# Altium integrated library BYTECH_HW_LIB_2019.IntLib: 907 symbols (part 5 of 6) (continued)
## W3073 (continued)
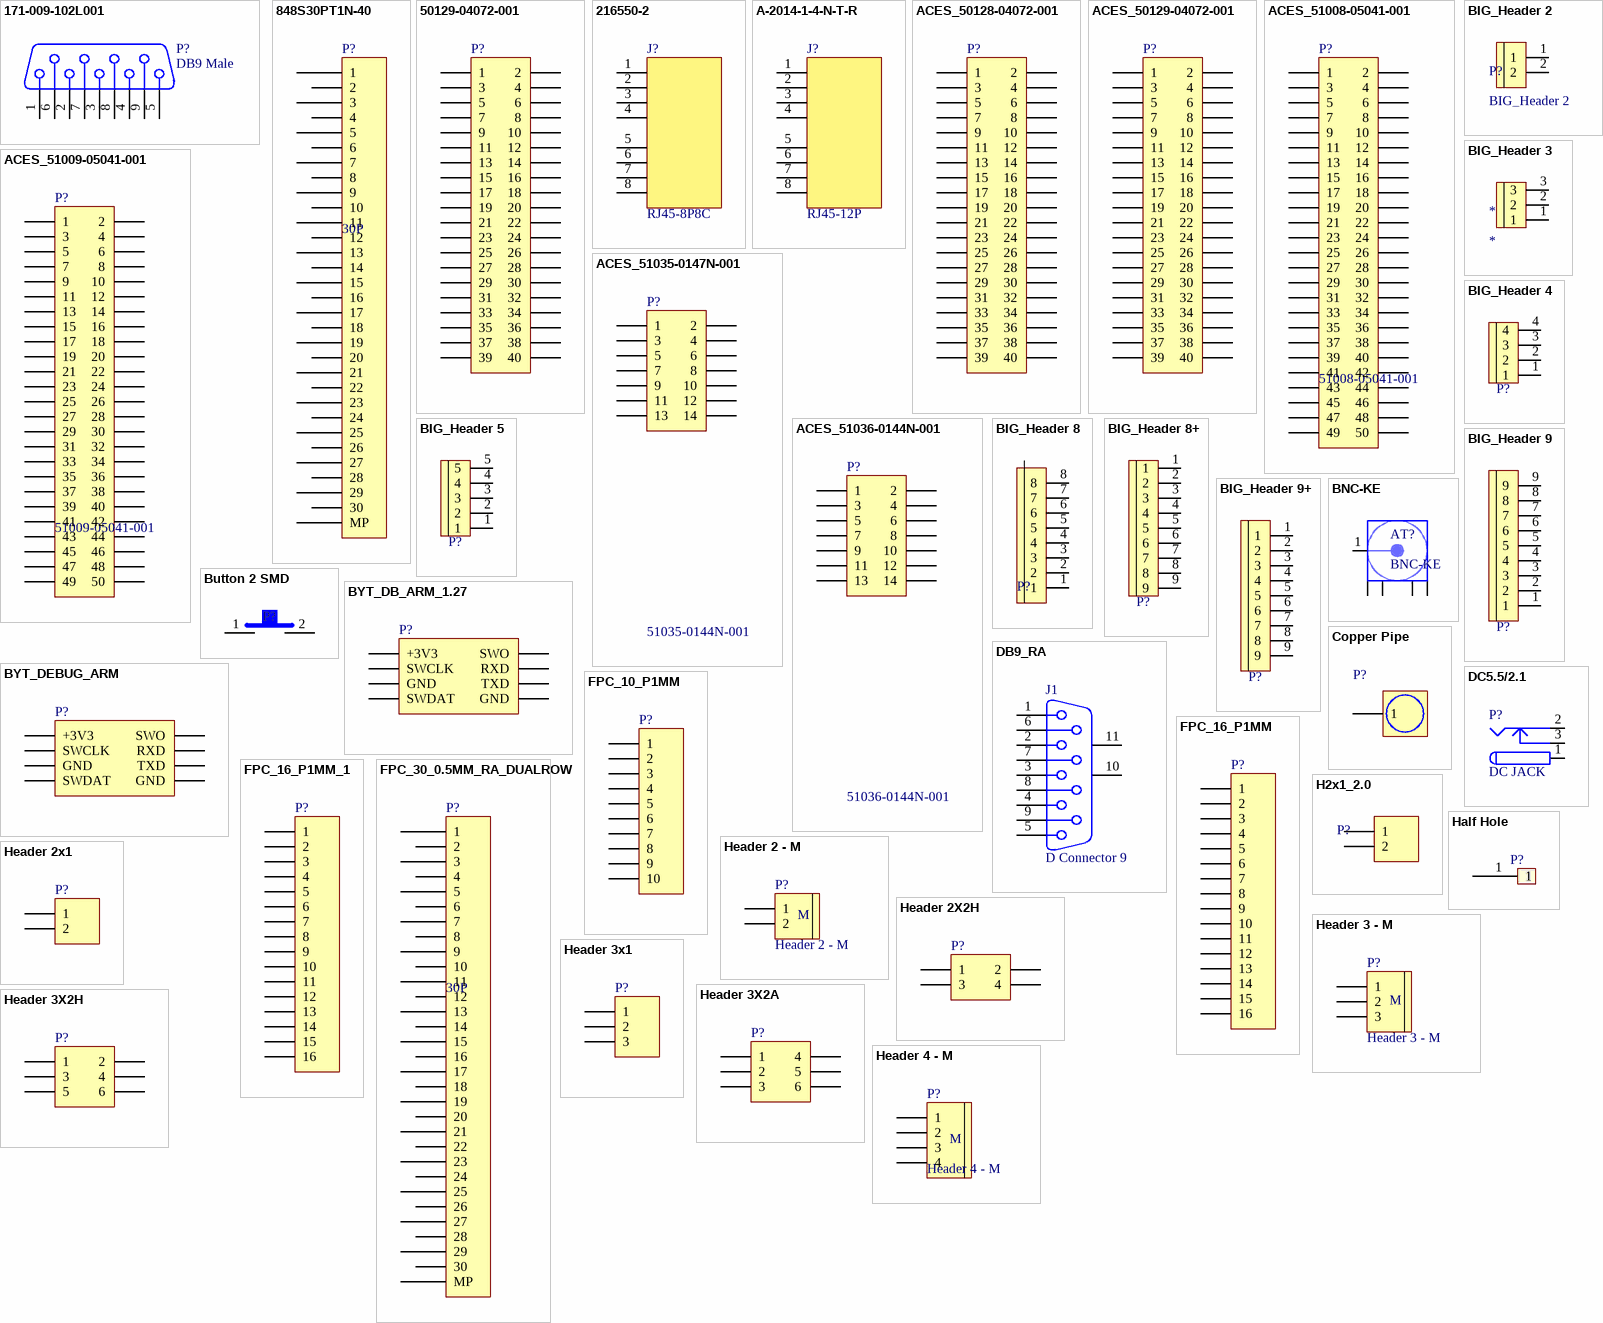
[diagram p31: symbols 171-009-102L001 to Header 4 - M]

## 171-009-102L001
designator P?, comment DB9 Male
Receptacle Assembly, 9 Position, Right Angle; MPN: 171-009-102L001; CompanyID: VT-00352; Solder: HAND; Value: DB9 Male
footprint DB9.SMD
signal-integrity model Connector
pins: 1, 2, 3, 4, 5, 6, 7, 8, 9

## 848S30PT1N-40
designator P?, comment 30P
FPC_30_0.5MM_RA_DUALROW; MFR: Ariba; MPN: 848S30PT1N-40; Solder: SMT; MFR_URL: https://item.taobao.com/item.htm?id=584733985113; Value: 30P
footprint 848S30PT1N-40 (Footprint not found)
pins: 0 MP, 1, 2, 3, 4, 5, 6, 7, 8, 9, 10, 11, 12, 13, 14, 15, 16, 17, 18, 19, 20, 21, 22, 23, 24, 25, 26, 27, 28, 29, 30

## 50129-04072-001
designator P?
Header, 20-Pin, Dual row, Right Angle; MFR: ACES; MPN: 50129-04072-001; Solder: WAVE; Value: 50129-04072-001
footprint ACES_50128-04072-001 (Footprint not found)
signal-integrity model Connector
pins: 1, 2, 3, 4, 5, 6, 7, 8, 9, 10, 11, 12, 13, 14, 15, 16, 17, 18, 19, 20, 21, 22, 23, 24, 25, 26, 27, 28, 29, 30, 31, 32, 33, 34, 35, 36, 37, 38, 39, 40

## 216550-2
designator J?, comment RJ45-8P8C
CONN MOD JACK 8P8C VERT UNSHLD; MFR: TE Connectivity AMP Connectors; MPN: 216550-2; Solder: WAVE
footprint 216550-2 (Footprint not found)
pins: 1, 2, 3, 4, 5, 6, 7, 8

## A-2014-1-4-N-T-R
designator J?, comment RJ45-12P
Solder: WAVE
footprint A-2014-1-4-N-T-R (Footprint not found)
pins: 1, 2, 3, 4, 5, 6, 7, 8

## ACES_50128-04072-001
designator P?
50128-04072-001 Dual Row, 40 pin, MALE; MFR: ACES; Solder: SMT; MPN: 50128-04072-001; Value: 50128-04072-001
footprint ACES_50128-04072-001 (Footprint not found)
signal-integrity model Connector
pins: 1, 2, 3, 4, 5, 6, 7, 8, 9, 10, 11, 12, 13, 14, 15, 16, 17, 18, 19, 20, 21, 22, 23, 24, 25, 26, 27, 28, 29, 30, 31, 32, 33, 34, 35, 36, 37, 38, 39, 40

## ACES_50129-04072-001
designator P?
50129-04072-001 Dual Row, 40 pin, FEMALE; MFR: ACES; Solder: SMT; MPN: 50129-04072-001; Value: 50129-04072-001
footprint ACES_50129-04072-001 (Footprint not found)
signal-integrity model Connector
pins: 1, 2, 3, 4, 5, 6, 7, 8, 9, 10, 11, 12, 13, 14, 15, 16, 17, 18, 19, 20, 21, 22, 23, 24, 25, 26, 27, 28, 29, 30, 31, 32, 33, 34, 35, 36, 37, 38, 39, 40

## ACES_51008-05041-001
designator P?, comment 51008-05041-001
51008-05041-001 Dual Row, 50 pin, MALE; MFR: ACES; MPN: ACES_51008-05041-001; Solder: SMT; Value: ACES_51008-05041-001; MPN2: 10132798-052100LF; MFR2: Amphenol ICC (FCI)
footprint ACES_51008-05041-001 (Footprint not found)
signal-integrity model Connector
pins: 1, 2, 3, 4, 5, 6, 7, 8, 9, 10, 11, 12, 13, 14, 15, 16, 17, 18, 19, 20, 21, 22, 23, 24, 25, 26, 27, 28, 29, 30, 31, 32, 33, 34, 35, 36, 37, 38, 39, 40, 41, 42, 43, 44, 45, 46, 47, 48, 49, 50

## ACES_51009-05041-001
designator P?, comment 51009-05041-001
51009-05041-001 Dual Row, 50 pin, FEMALE; MFR: ACES; MPN: ACES_51009-05041-001; Solder: SMT; MPN2: 10132797-055100LF; MFR2: Amphenol ICC (FCI)
footprint ACES_51009-05041-001
signal-integrity model Connector
pins: 1, 2, 3, 4, 5, 6, 7, 8, 9, 10, 11, 12, 13, 14, 15, 16, 17, 18, 19, 20, 21, 22, 23, 24, 25, 26, 27, 28, 29, 30, 31, 32, 33, 34, 35, 36, 37, 38, 39, 40, 41, 42, 43, 44, 45, 46, 47, 48, 49, 50

## ACES_51035-0147N-001
designator P?, comment 51035-0144N-001
51035-0147N-001 Dual Row, 14 pin, MALE; MFR: ACES; Solder: SMT; MPN: 51035-0147N-001; Value: 51035-0147N-001
footprint ACES_51035-0147N-001 (Footprint not found)
signal-integrity model Connector
pins: 1, 2, 3, 4, 5, 6, 7, 8, 9, 10, 11, 12, 13, 14

## ACES_51036-0144N-001
designator P?, comment 51036-0144N-001
51036-0144N-001 Dual Row, 14 pin, FEMALE; MFR: ACES; Solder: SMT; MPN: 51036-0144N-001; Value: 51036-0144N-001
footprint ACES_51036-0144N-001 (Footprint not found)
signal-integrity model Connector
pins: 1, 2, 3, 4, 5, 6, 7, 8, 9, 10, 11, 12, 13, 14

## BIG_Header 2
designator P?
footprint BIG_Header 2
pins: 1, 2

## BIG_Header 3
designator *
footprint BIG_Header 3
pins: 1, 2, 3

## BIG_Header 4
designator P?, comment BIG Header 4  (value not drawn)
footprint BIG_Header 4
pins: 1, 2, 3, 4

## BIG_Header 5
designator P?, comment BIG Header 4  (value not drawn)
footprint BIG_Header 5
pins: 1, 2, 3, 4, 5

## BIG_Header 8
designator P?, comment BIG Heager 8  (value not drawn)
footprint BIG_Header 8
pins: 1, 2, 3, 4, 5, 6, 7, 8

## BIG_Header 8+
designator P?, comment BIG Heager 8+  (value not drawn)
footprint BIG_Header 9
pins: 1, 2, 3, 4, 5, 6, 7, 8, 9

## BIG_Header 9
designator P?, comment BIG Heager 9  (value not drawn)
footprint BIG_Header 9
pins: 1, 2, 3, 4, 5, 6, 7, 8, 9

## BIG_Header 9+
designator P?, comment BIG Heager 9+  (value not drawn)
footprint BIG_Header 9
pins: 1, 2, 3, 4, 5, 6, 7, 8, 9

## BNC-KE
designator AT?
Solder: WAVE; MFR_URL: https://detail.tmall.com/item.htm?id=600889032311&ali_refid=a3_430620_1006:1106519694:N:bqURkf1/6XELXFWgHn0phw==:e744e300de7662eb842b86005d159f1e&ali_trackid=1_e744e300de7662eb842b86005d159f1e&spm=a230r.1.14.1&skuId=4376461827836; MPN: BNC-KE
footprint BNC-KE
pins: 1 Signal "Signal Pin", 2 (power), 2 (power), 2 (power), 2 (power)

## Button 2 SMD
designator P?
SMD Mini Push Button Switch 2 Pin 3x6x2.7mm; MPN: SMD Mini Push Button 2 SMD; Link: https://ram-e-shop.com/product/press2pin-smd/
footprint SW 2P SMD
pins: 1, 2

## BYT_DB_ARM_1.27
designator P?
BYTECH DEBUG PORT FOR ARM; Solder: WAVE
footprint IDE8 1.27mm
signal-integrity model Connector
footprint HDR2X4_CEN - 2MM (Connector; Header; 4x2 Position)
pins: 1 +3V3, 2 SWO, 3 SWCLK, 4 RXD, 5 GND, 6 TXD, 7 SWDAT, 8 GND

## BYT_DEBUG_ARM
designator P?
BYTECH DEBUG PORT FOR ARM; Solder: WAVE
footprint HDR2X4_CEN (Connector; Header; 4x2 Position)
signal-integrity model Connector
footprint HDR2X4_CEN - 2MM (Connector; Header; 4x2 Position)
pins: 1 +3V3, 2 SWCLK, 3 GND, 4 SWDAT, 5 SWO, 6 RXD, 7 TXD, 8 GND

## Copper Pipe
designator P?
Copper Pipe M3; Solder: WAVE
footprint Copper Pipe M3
pins: 1

## DB9_RA
designator J1, comment D Connector 9
Receptacle Assembly, 9 Position, Right Angle; PackageDocument: O; Positions: 9; Published: 15-Jun-2001; LatestRevisionDate: 17-Jul-2002; LatestRevisionNote: Re-released for DXP Platform.; DatasheetDocument: 1-Sep-1999; PackageReference: 788750; Publisher: Altium Limited; Orientation: Right Angle; Gender: Receptacle
footprint DSUB1.385-2H9 (Connector; D Subminiature; 9 Position; Right Angle; Pitch 1.385 mm)
signal-integrity model Connector
pins: 1, 2, 3, 4, 5, 6, 7, 8, 9, 10 MH1, 11 MH2

## DC5.5/2.1
designator P?, comment DC JACK
Low Voltage Power Supply Connector; Solder: WAVE
footprint DC5.5/2.1 (DC JACK 5.5/2.1mm)
signal-integrity model Connector
pins: 1 (power), 2 (power), 3 (power)

## FPC_10_P1MM
designator P?
Header, 10-Pin; Solder: SMT
footprint FPC_10_P1MM (Footprint not found)
pins: 1, 2, 3, 4, 5, 6, 7, 8, 9, 10

## FPC_16_P1MM
designator P?
Header, 16-Pin; Solder: SMT
footprint FPC_16_P1MM (Footprint not found)
pins: 1, 2, 3, 4, 5, 6, 7, 8, 9, 10, 11, 12, 13, 14, 15, 16

## FPC_16_P1MM_1
designator P?
Header, 16-Pin; Solder: SMT
footprint FPC_16_P1MM (Footprint not found)
pins: 1, 2, 3, 4, 5, 6, 7, 8, 9, 10, 11, 12, 13, 14, 15, 16

## FPC_30_0.5MM_RA_DUALROW
designator P?, comment 30P
FPC_30_0.5MM_RA_DUALROW; MFR: AISU; Solder: SMT; MFR_URL: https://detail.tmall.com/item.htm?id=580113708551&rn=8ff0bf25cc32f12d0ad2de94d2fc9809&abbucket=6&skuId=3867202437827; Value: 30P
footprint FPC_30_0.5MM_RA_DUALROW_HAND
footprint FPC_30_0.5MM_RA_DUALROW_SMT
pins: 0 MP, 1, 2, 3, 4, 5, 6, 7, 8, 9, 10, 11, 12, 13, 14, 15, 16, 17, 18, 19, 20, 21, 22, 23, 24, 25, 26, 27, 28, 29, 30

## H2x1_2.0
designator P?
Header 2x1, pitch 2mm; Solder: WAVE
footprint HDR200_1x2
pins: 1, 2

## Half Hole
designator P?, comment 1  (value not drawn)
footprint Hafl Hole 0.7mm
pins: 1

## Header 2 - M
designator P?
Header, 2-Pin, Medium; LatestRevisionDate: 17-Jul-2002; LatestRevisionNote: Re-released for DXP Platform.; Publisher: Altium Limited
footprint Medium - Header 2
signal-integrity model Connector
pins: 1, 2
text: M

## Header 2x1
designator P?
Header, 2-Pin, pitch 2.54mm; Solder: WAVE
footprint HDR1X2 (Connector; Header; 2 Position)
signal-integrity model Connector
pins: 1, 2

## Header 2X2H
designator P?
Header, 2-Pin, Dual row, Right Angle; Solder: WAVE
footprint HDR2X2H (Connector; Header; 2x2 Position; Right Angle)
signal-integrity model Connector
pins: 1, 2, 3, 4

## Header 3 - M
designator P?
Header, 3-Pin, Medium; LatestRevisionDate: 17-Jul-2002; LatestRevisionNote: Re-released for DXP Platform.; Publisher: Altium Limited
footprint Medium - Header 3
signal-integrity model Connector
pins: 1, 2, 3
text: M

## Header 3x1
designator P?
Header, 3-Pin, pitch 2.54mm; Solder: WAVE
footprint HDR1X3 (Connector; Header; 3 Position)
signal-integrity model Connector
pins: 1, 2, 3

## Header 3X2A
designator P?
Header, 3-Pin, Dual row; Solder: WAVE
footprint HDR2X3_CEN (Connector; Header; 3x2 Position)
signal-integrity model Connector
pins: 1, 2, 3, 4, 5, 6

## Header 3X2H
designator P?
Header, 3-Pin, Dual row, Right Angle; Solder: WAVE
footprint HDR2X3H (Connector; Header; 3x2 Position; Right Angle)
signal-integrity model Connector
pins: 1, 2, 3, 4, 5, 6

## Header 4 - M
designator P?
Header, 3-Pin, Medium; LatestRevisionDate: 17-Jul-2002; LatestRevisionNote: Re-released for DXP Platform.; Publisher: Altium Limited
footprint Medium - Header 4
signal-integrity model Connector
pins: 1, 2, 3, 4
text: M

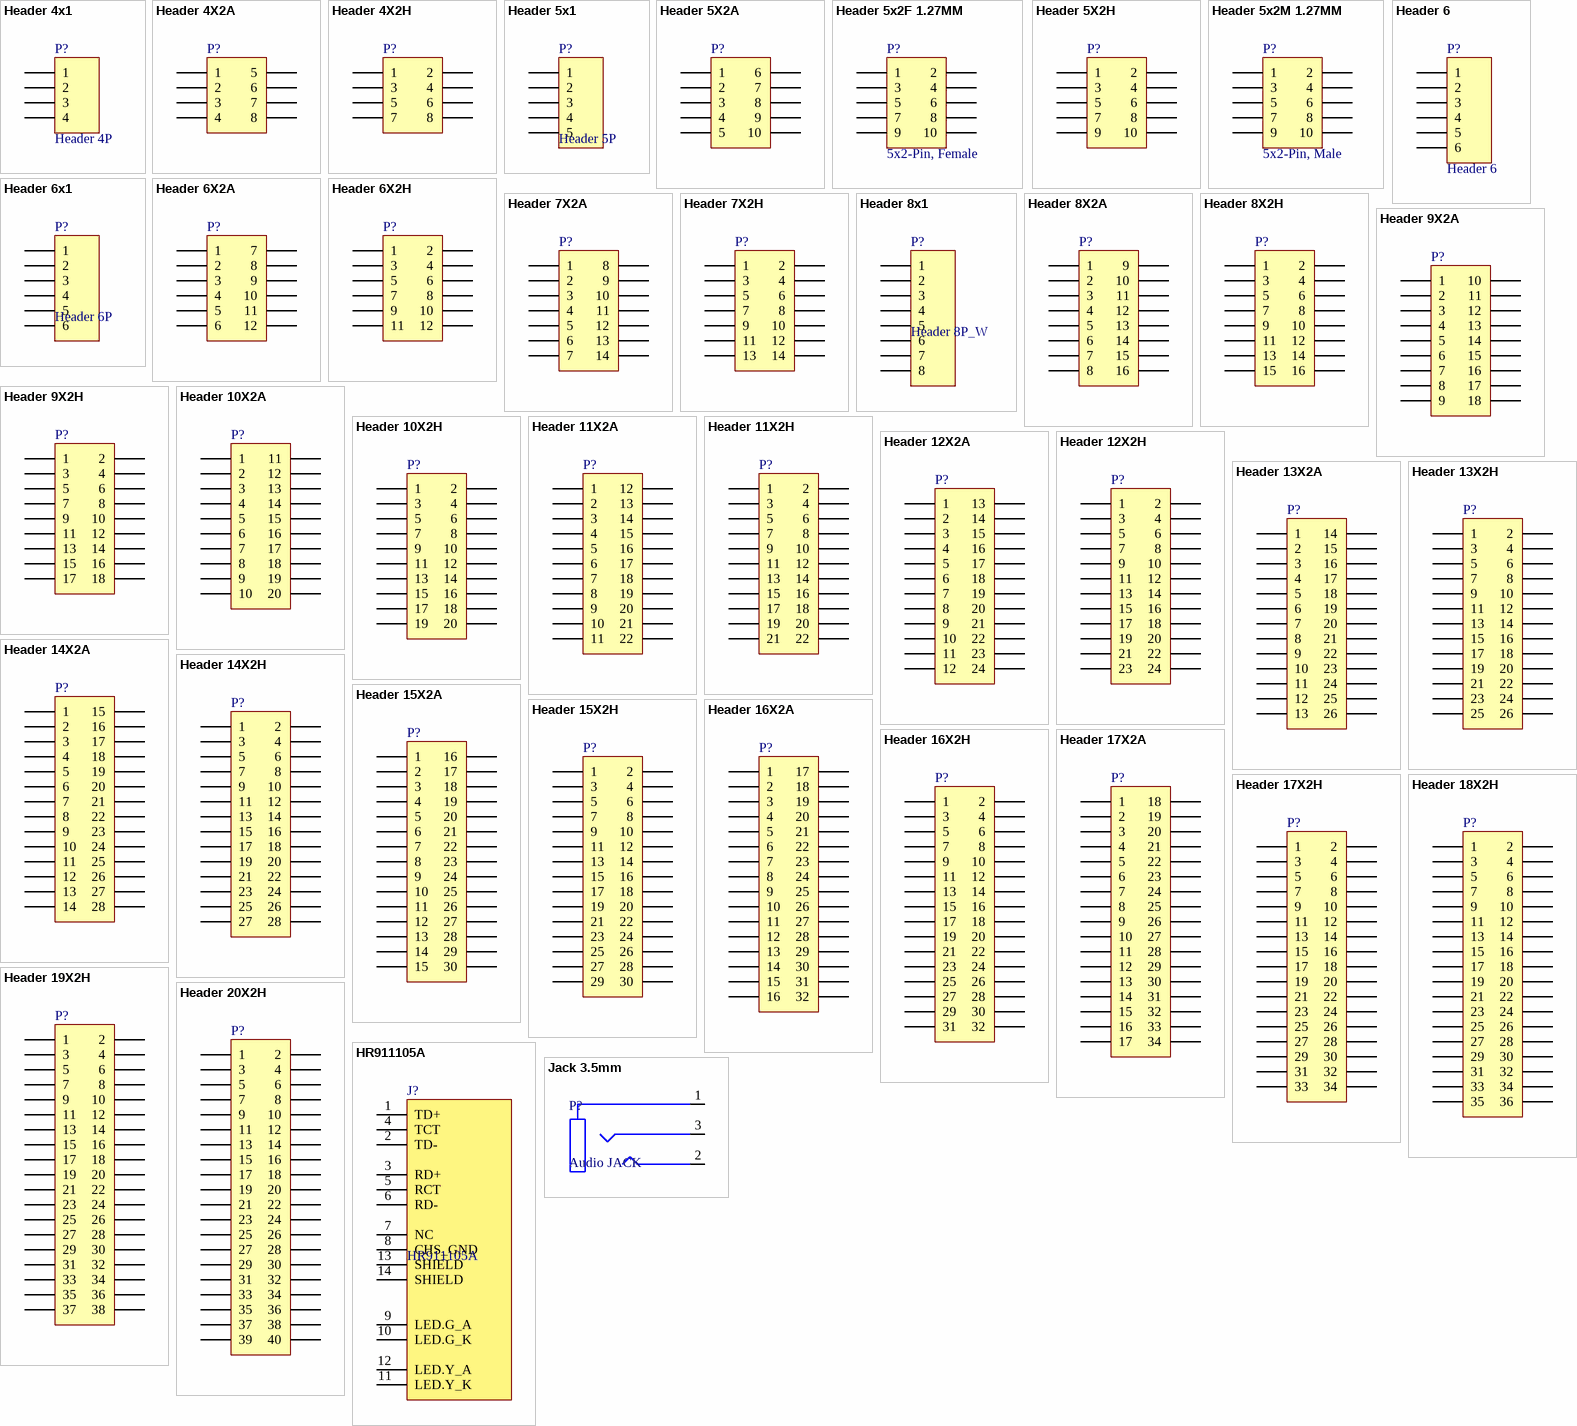
[diagram p32: symbols Header 4x1 to Jack 3.5mm]

## Header 4x1
designator P?, comment Header 4P
Header, 4 Pin Pitch 2.54mm; MPN: S1012EC-40-ND; CompanyID: VT-00125; Solder: WAVE; Value: Header 4P
footprint HDR1X4 (Connector; Header; 4 Position)
pins: 1, 2, 3, 4

## Header 4X2A
designator P?
Header, 4-Pin, Dual row; Solder: WAVE
footprint HDR2X4_CEN (Connector; Header; 4x2 Position)
signal-integrity model Connector
pins: 1, 2, 3, 4, 5, 6, 7, 8

## Header 4X2H
designator P?
Header, 4-Pin, Dual row, Right Angle; Solder: WAVE
footprint HDR2X4H (Connector; Header; 4x2 Position; Right Angle)
signal-integrity model Connector
pins: 1, 2, 3, 4, 5, 6, 7, 8

## Header 5x1
designator P?, comment Header 5P
Header, 5 Pin Pitch 2.54mm; MPN: S1012EC-40-ND; CompanyID: VT-00125; Solder: WAVE; Value: Header 5P
footprint HDR1X5 (Connector; Header; 5 Position)
pins: 1, 2, 3, 4, 5

## Header 5X2A
designator P?
Header, 5-Pin, Dual row; Solder: WAVE
footprint HDR2X5_CEN (Connector; Header; 5x2 Position)
signal-integrity model Connector
pins: 1, 2, 3, 4, 5, 6, 7, 8, 9, 10

## Header 5x2F 1.27MM
designator P?, comment 5x2-Pin, Female
Header Female, 5x2-Pin, Pitch 1.27mm; MPN: 525674025852; CompanyID: VT-01108; Solder: HAND; Value: 5x2-Pin, Female
footprint HDR_5x2_1.27 FEMALE (HDR127_5x2_FEMALE)
pins: 1, 2, 3, 4, 5, 6, 7, 8, 9, 10

## Header 5X2H
designator P?
Header, 5-Pin, Dual row, Right Angle; Solder: WAVE
footprint HDR2X5H (Connector; Header; 5x2 Position; Right Angle)
signal-integrity model Connector
pins: 1, 2, 3, 4, 5, 6, 7, 8, 9, 10

## Header 5x2M 1.27MM
designator P?, comment 5x2-Pin, Male
Header Male, 5x2-Pin, Pitch 1.27mm; MPN: 525673713482; CompanyID: VT-01107; Solder: HAND; Value: 5x2-Pin, Male
footprint HDR_5x2_1.27 MALE (HDR127_5x2_MALE)
pins: 1, 2, 3, 4, 5, 6, 7, 8, 9, 10

## Header 6
designator P?
Header, 6-Pin; Solder: WAVE
footprint HDR1X6 (Connector; Header; 6 Position)
signal-integrity model Connector
pins: 1, 2, 3, 4, 5, 6

## Header 6x1
designator P?, comment Header 6P
Header, 6 Pin Pitch 2.54mm; MPN: S1012EC-40-ND; CompanyID: VT-00125; Solder: WAVE; Value: Header 6P
footprint HDR1X6 (Connector; Header; 6 Position)
pins: 1, 2, 3, 4, 5, 6

## Header 6X2A
designator P?
Header, 6-Pin, Dual row; Solder: WAVE
footprint HDR2X6_CEN (Connector; Header; 6x2 Position)
signal-integrity model Connector
pins: 1, 2, 3, 4, 5, 6, 7, 8, 9, 10, 11, 12

## Header 6X2H
designator P?
Header, 6-Pin, Dual row, Right Angle; Solder: WAVE
footprint HDR2X6H (Connector; Header; 6x2 Position; Right Angle)
signal-integrity model Connector
pins: 1, 2, 3, 4, 5, 6, 7, 8, 9, 10, 11, 12

## Header 7X2A
designator P?
Header, 7-Pin, Dual row; Solder: WAVE
footprint HDR2X7_CEN (Connector; Header; 7x2 Position)
signal-integrity model Connector
pins: 1, 2, 3, 4, 5, 6, 7, 8, 9, 10, 11, 12, 13, 14

## Header 7X2H
designator P?
Header, 7-Pin, Dual row, Right Angle; Solder: WAVE
footprint HDR2X7H (Connector; Header; 7x2 Position; Right Angle)
signal-integrity model Connector
pins: 1, 2, 3, 4, 5, 6, 7, 8, 9, 10, 11, 12, 13, 14

## Header 8x1
designator P?, comment Header 8P_W
Header, 8 Pin Pitch 2.54mm; Solder: WAVE; Value: Header 8P_W
footprint HDR1X8 - W (Connector; Header; 8 Position)
pins: 1, 2, 3, 4, 5, 6, 7, 8

## Header 8X2A
designator P?
Header, 8-Pin, Dual row; Solder: WAVE
footprint HDR2X8_CEN (Connector; Header; 8x2 Position)
signal-integrity model Connector
pins: 1, 2, 3, 4, 5, 6, 7, 8, 9, 10, 11, 12, 13, 14, 15, 16

## Header 8X2H
designator P?
Header, 8-Pin, Dual row, Right Angle; Solder: WAVE
footprint HDR2X8H (Connector; Header; 8x2 Position; Right Angle)
signal-integrity model Connector
pins: 1, 2, 3, 4, 5, 6, 7, 8, 9, 10, 11, 12, 13, 14, 15, 16

## Header 9X2A
designator P?
Header, 9-Pin, Dual row; Solder: WAVE
footprint HDR2X9_CEN (Connector; Header; 9x2 Position)
signal-integrity model Connector
pins: 1, 2, 3, 4, 5, 6, 7, 8, 9, 10, 11, 12, 13, 14, 15, 16, 17, 18

## Header 9X2H
designator P?
Header, 9-Pin, Dual row, Right Angle; Solder: WAVE
footprint HDR2X9H (Connector; Header; 9x2 Position; Right Angle)
signal-integrity model Connector
pins: 1, 2, 3, 4, 5, 6, 7, 8, 9, 10, 11, 12, 13, 14, 15, 16, 17, 18

## Header 10X2A
designator P?
Header, 10-Pin, Dual row; Solder: WAVE
footprint HDR2X10_CEN (Connector; Header; 10x2 Position)
signal-integrity model Connector
pins: 1, 2, 3, 4, 5, 6, 7, 8, 9, 10, 11, 12, 13, 14, 15, 16, 17, 18, 19, 20

## Header 10X2H
designator P?
Header, 10-Pin, Dual row, Right Angle; Solder: WAVE
footprint HDR2X10H (Connector; Header; 10x2 Position; Right Angle)
signal-integrity model Connector
pins: 1, 2, 3, 4, 5, 6, 7, 8, 9, 10, 11, 12, 13, 14, 15, 16, 17, 18, 19, 20

## Header 11X2A
designator P?
Header, 11-Pin, Dual row; Solder: WAVE
footprint HDR2X11_CEN (Connector; Header; 11x2 Position)
signal-integrity model Connector
pins: 1, 2, 3, 4, 5, 6, 7, 8, 9, 10, 11, 12, 13, 14, 15, 16, 17, 18, 19, 20, 21, 22

## Header 11X2H
designator P?
Header, 11-Pin, Dual row, Right Angle; Solder: WAVE
footprint HDR2X11H (Connector; Header; 11x2 Position; Right Angle)
signal-integrity model Connector
pins: 1, 2, 3, 4, 5, 6, 7, 8, 9, 10, 11, 12, 13, 14, 15, 16, 17, 18, 19, 20, 21, 22

## Header 12X2A
designator P?
Header, 12-Pin, Dual row; Solder: WAVE
footprint HDR2X12_CEN (Connector; Header; 12x2 Position)
signal-integrity model Connector
pins: 1, 2, 3, 4, 5, 6, 7, 8, 9, 10, 11, 12, 13, 14, 15, 16, 17, 18, 19, 20, 21, 22, 23, 24

## Header 12X2H
designator P?
Header, 12-Pin, Dual row, Right Angle; Solder: WAVE
footprint HDR2X12H (Connector; Header; 12x2 Position; Right Angle)
signal-integrity model Connector
pins: 1, 2, 3, 4, 5, 6, 7, 8, 9, 10, 11, 12, 13, 14, 15, 16, 17, 18, 19, 20, 21, 22, 23, 24

## Header 13X2A
designator P?
Header, 13-Pin, Dual row; Solder: WAVE
footprint HDR2X13_CEN (Connector; Header; 13x2 Position)
signal-integrity model Connector
pins: 1, 2, 3, 4, 5, 6, 7, 8, 9, 10, 11, 12, 13, 14, 15, 16, 17, 18, 19, 20, 21, 22, 23, 24, 25, 26

## Header 13X2H
designator P?
Header, 13-Pin, Dual row, Right Angle; Solder: WAVE
footprint HDR2X13H (Connector; Header; 13x2 Position; Right Angle)
signal-integrity model Connector
pins: 1, 2, 3, 4, 5, 6, 7, 8, 9, 10, 11, 12, 13, 14, 15, 16, 17, 18, 19, 20, 21, 22, 23, 24, 25, 26

## Header 14X2A
designator P?
Header, 14-Pin, Dual row; Solder: WAVE
footprint HDR2X14_CEN (Connector; Header; 14x2 Position)
signal-integrity model Connector
pins: 1, 2, 3, 4, 5, 6, 7, 8, 9, 10, 11, 12, 13, 14, 15, 16, 17, 18, 19, 20, 21, 22, 23, 24, 25, 26, 27, 28

## Header 14X2H
designator P?
Header, 14-Pin, Dual row, Right Angle; Solder: WAVE
footprint HDR2X14H (Connector; Header; 14x2 Position; Right Angle)
signal-integrity model Connector
pins: 1, 2, 3, 4, 5, 6, 7, 8, 9, 10, 11, 12, 13, 14, 15, 16, 17, 18, 19, 20, 21, 22, 23, 24, 25, 26, 27, 28

## Header 15X2A
designator P?
Header, 15-Pin, Dual row; Solder: WAVE
footprint HDR2X15_CEN (Connector; Header; 15x2 Position)
signal-integrity model Connector
pins: 1, 2, 3, 4, 5, 6, 7, 8, 9, 10, 11, 12, 13, 14, 15, 16, 17, 18, 19, 20, 21, 22, 23, 24, 25, 26, 27, 28, 29, 30

## Header 15X2H
designator P?
Header, 15-Pin, Dual row, Right Angle; Solder: WAVE
footprint HDR2X15H (Connector; Header; 15x2 Position; Right Angle)
signal-integrity model Connector
pins: 1, 2, 3, 4, 5, 6, 7, 8, 9, 10, 11, 12, 13, 14, 15, 16, 17, 18, 19, 20, 21, 22, 23, 24, 25, 26, 27, 28, 29, 30

## Header 16X2A
designator P?
Header, 16-Pin, Dual row; Solder: WAVE
footprint HDR2X16_CEN (Connector; Header; 16x2 Position)
signal-integrity model Connector
pins: 1, 2, 3, 4, 5, 6, 7, 8, 9, 10, 11, 12, 13, 14, 15, 16, 17, 18, 19, 20, 21, 22, 23, 24, 25, 26, 27, 28, 29, 30, 31, 32

## Header 16X2H
designator P?
Header, 16-Pin, Dual row, Right Angle; Solder: WAVE
footprint HDR2X16H (Connector; Header; 16x2 Position; Right Angle)
signal-integrity model Connector
pins: 1, 2, 3, 4, 5, 6, 7, 8, 9, 10, 11, 12, 13, 14, 15, 16, 17, 18, 19, 20, 21, 22, 23, 24, 25, 26, 27, 28, 29, 30, 31, 32

## Header 17X2A
designator P?
Header, 17-Pin, Dual row; Solder: WAVE
footprint HDR2X17_CEN (Connector; Header; 17x2 Position)
signal-integrity model Connector
pins: 1, 2, 3, 4, 5, 6, 7, 8, 9, 10, 11, 12, 13, 14, 15, 16, 17, 18, 19, 20, 21, 22, 23, 24, 25, 26, 27, 28, 29, 30, 31, 32, 33, 34

## Header 17X2H
designator P?
Header, 17-Pin, Dual row, Right Angle; Solder: WAVE
footprint HDR2X17H (Connector; Header; 17x2 Position; Right Angle)
signal-integrity model Connector
pins: 1, 2, 3, 4, 5, 6, 7, 8, 9, 10, 11, 12, 13, 14, 15, 16, 17, 18, 19, 20, 21, 22, 23, 24, 25, 26, 27, 28, 29, 30, 31, 32, 33, 34

## Header 18X2H
designator P?
Header, 18-Pin, Dual row, Right Angle; Solder: WAVE
footprint HDR2X18H (Connector; Header; 18x2 Position; Right Angle)
signal-integrity model Connector
pins: 1, 2, 3, 4, 5, 6, 7, 8, 9, 10, 11, 12, 13, 14, 15, 16, 17, 18, 19, 20, 21, 22, 23, 24, 25, 26, 27, 28, 29, 30, 31, 32, 33, 34, 35, 36

## Header 19X2H
designator P?
Header, 19-Pin, Dual row, Right Angle; Solder: WAVE
footprint HDR2X19H (Connector; Header; 19x2 Position; Right Angle)
signal-integrity model Connector
pins: 1, 2, 3, 4, 5, 6, 7, 8, 9, 10, 11, 12, 13, 14, 15, 16, 17, 18, 19, 20, 21, 22, 23, 24, 25, 26, 27, 28, 29, 30, 31, 32, 33, 34, 35, 36, 37, 38

## Header 20X2H
designator P?
Header, 20-Pin, Dual row, Right Angle; Solder: WAVE
footprint HDR2X20H (Connector; Header; 20x2 Position; Right Angle)
signal-integrity model Connector
pins: 1, 2, 3, 4, 5, 6, 7, 8, 9, 10, 11, 12, 13, 14, 15, 16, 17, 18, 19, 20, 21, 22, 23, 24, 25, 26, 27, 28, 29, 30, 31, 32, 33, 34, 35, 36, 37, 38, 39, 40

## HR911105A
designator J?
Hanrun HR911105A RJ-45 Connector; Solder: WAVE; MPN: HR911105A; MFR: HanRun; Value: HR911105A
footprint HR911105A (Hanrun HR911105A RJ-45 Connector)
pins: 1 TD+, 2 TD-, 3 RD+, 4 TCT, 5 RCT, 6 RD-, 7 NC, 8 CHS_GND, 9 LED.G_A, 10 LED.G_K, 11 LED.Y_K, 12 LED.Y_A, 13 SHIELD, 14 SHIELD

## Jack 3.5mm
designator P?, comment Audio JACK
Jack audio 3.5mm; MFR: Kycon, Inc.; MPN: STX-3501-3N; Solder: WAVE; Value: STX-3501-3N
footprint Jack 3.5mm (Jack audio 3.5mm)
pins: 1, 2, 3

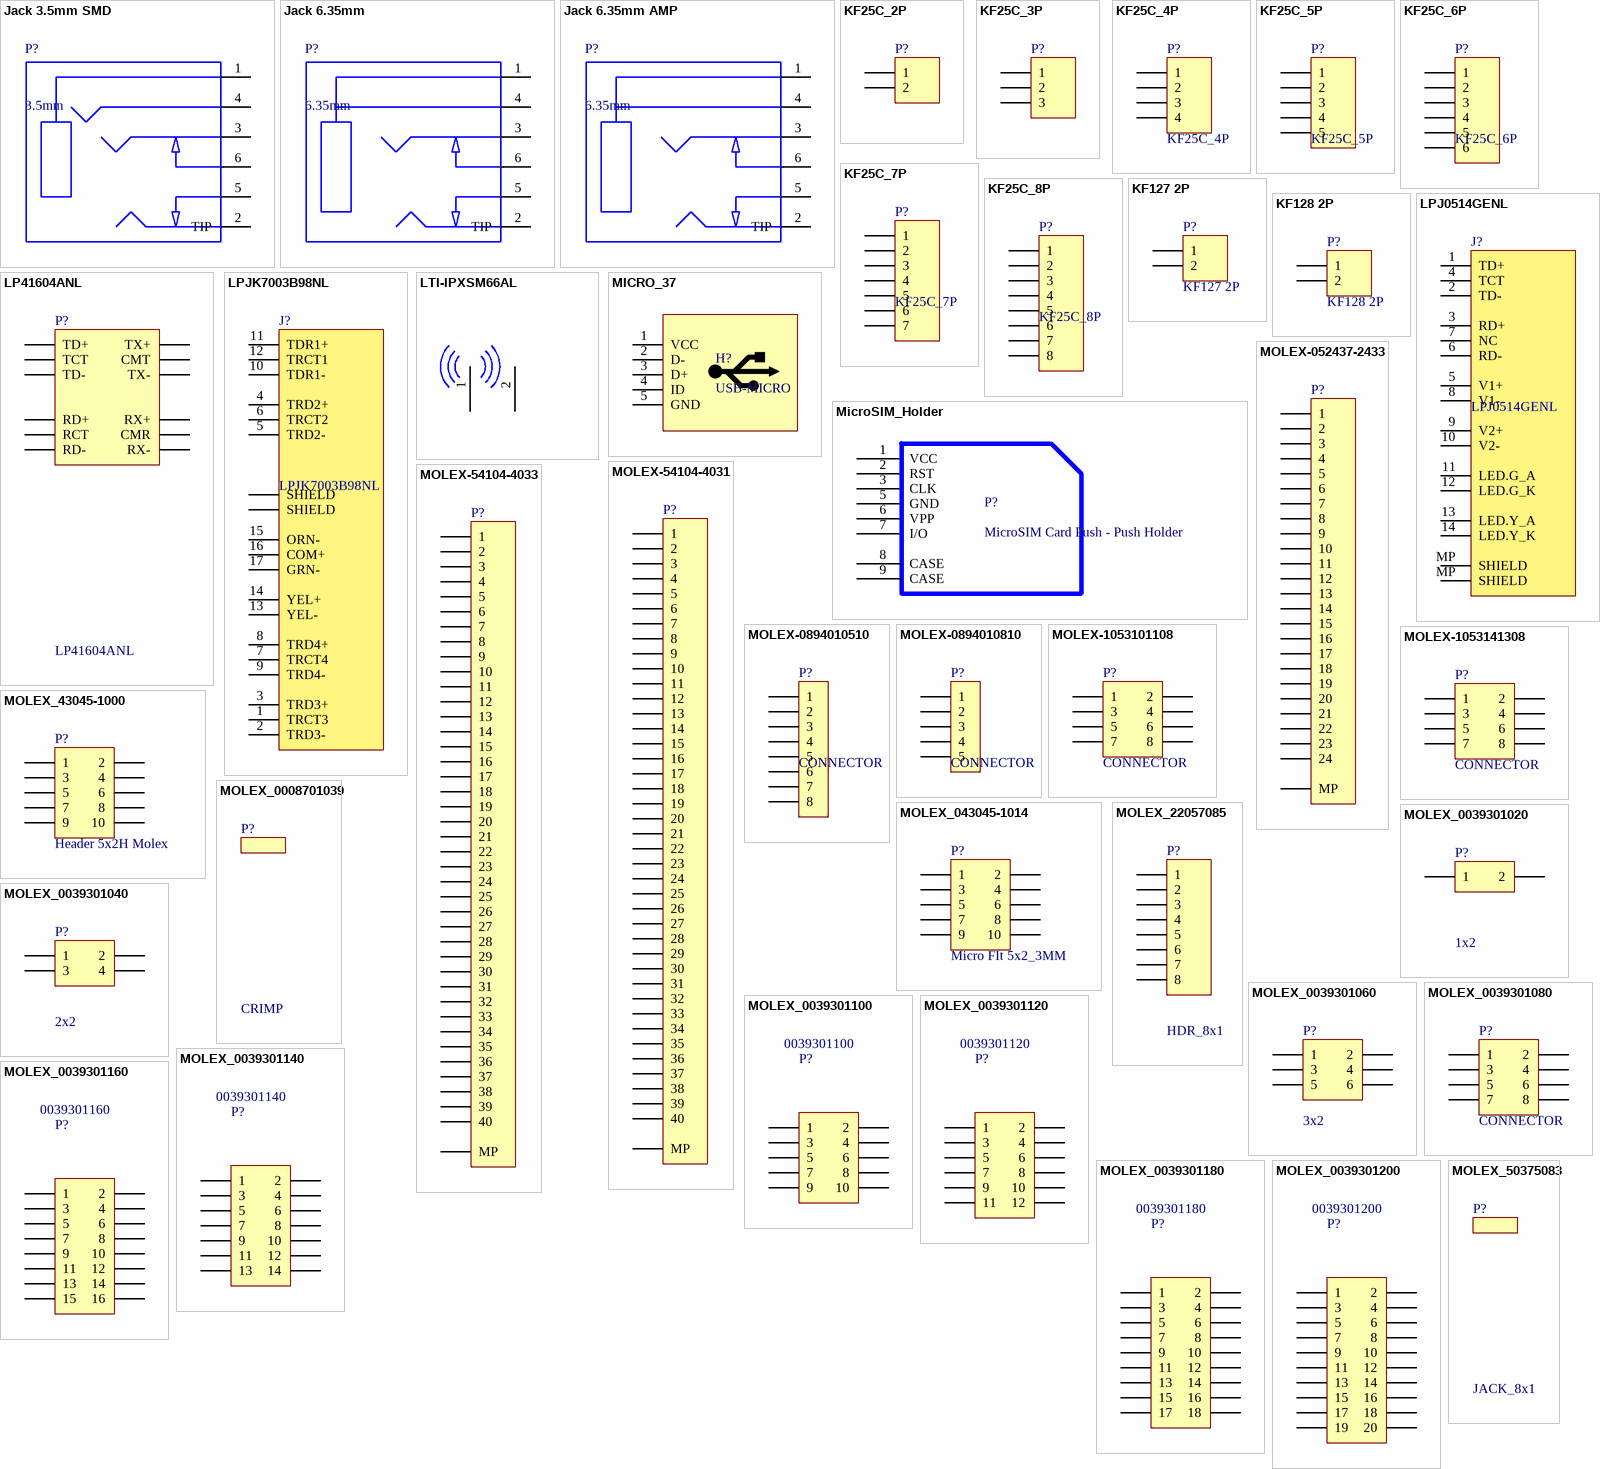
[diagram p33: symbols Jack 3.5mm SMD to MOLEX_50375083]

## Jack 3.5mm SMD
designator P?, comment 3.5mm
CONN JACK 4COND 3.5MM SMD R/A; MFR: CUI Devices; MPN: SJ-43516-SMT-TR-BE; Solder: WAVE; Value: SJ-43516-SMT-TR-BE
footprint Jack 3.5mm - SMD (Jack audio 3.5mm)
pins: 1 SLEEVE, 2 TIP, 3 RING1, 4 RING2, 5 TIP_SWITCH, 6 RING_SWITCH

## Jack 6.35mm
designator P?, comment 6.35mm
CONN JACK STEREO 6.35MM R/A; MFR: Switchcraft Inc.; MPN: SN49C14B; Solder: WAVE; Value: SN49C14B
footprint Jack 6.35mm 6P (Jack audio 6.35 mm)
pins: 1 SLEEVE, 2 TIP, 3 RING, 4 SLEEVE, 5 TIP_SWITCH, 6 RING_SWITCH

## Jack 6.35mm AMP
designator P?, comment 6.35mm
CONN JACK STEREO 1/4" R/A; MFR: Amphenol Sine Systems Corp; MPN: ACJS-MHOM; Solder: WAVE; Value: ACJS-MHOM
footprint Jack 6.35mm 6P - China (Jack audio 6.35 mm)
pins: 1 SLEEVE, 2 TIP, 3 RING, 4 SLEEVE, 5 TIP_SWITCH, 6 RING_SWITCH

## KF25C_2P
designator P?
Header, 2-Pin, pitch 7.62mm; MPN: KF25C_2P; Solder: WAVE; Value: KF25C_2P
footprint KF25C_2P
signal-integrity model Connector
pins: 1, 2

## KF25C_3P
designator P?
Header, 3-Pin, pitch 7.62mm; MPN: KF25C_3P; Solder: WAVE; Value: KF25C_3P
footprint KF25C_3P
signal-integrity model Connector
pins: 1, 2, 3

## KF25C_4P
designator P?
Header, 4 Pin Pitch 7.62mm; Solder: WAVE; Value: KF25C_4P; MPN: KF25C_4P
footprint KF25C_4P
pins: 1, 2, 3, 4

## KF25C_5P
designator P?
Header, 5 Pin Pitch 7.62mm; Solder: WAVE; Value: KF25C_5P; MPN: KF25C_5P
footprint KF25C_5P
pins: 1, 2, 3, 4, 5

## KF25C_6P
designator P?
Header, 6 Pin Pitch 7.62mm; Solder: WAVE; Value: KF25C_6P; MPN: KF25C_6P
footprint KF25C_6P
pins: 1, 2, 3, 4, 5, 6

## KF25C_7P
designator P?
Header, 7 Pin Pitch 7.62mm; Solder: WAVE; Value: KF25C_7P; MPN: KF25C_7P
footprint KF25C_7P
pins: 1, 2, 3, 4, 5, 6, 7

## KF25C_8P
designator P?
Header, 8 Pin Pitch 7.62mm; Solder: WAVE; Value: KF25C_8P; MPN: KF25C_8P
footprint KF25C_8P
pins: 1, 2, 3, 4, 5, 6, 7, 8

## KF127 2P
designator P?
Header, 2-Pin, pitch 5.08mm; MPN: KF127-2P; Solder: WAVE
footprint KF127_2P (Header 2,pitch 5.08mm, Colour Green)
pins: 1, 2

## KF128 2P
designator P?
Header, 2-Pin, pitch 5.08mm; MPN: KF128-2P; Solder: WAVE
footprint KF128_2P (Header 2,pitch 5.08mm, Colour Green)
pins: 1, 2

## LP41604ANL
designator P?
ETH Transformer 12.70 x 9.65 x 2.29; MFR: LINK-PP; Solder: SMT; MPN: LP41604ANL; Value: LP41604ANL; MPN2: HR681686; MFR2: HanRun
footprint LP41604ANL (Footprint not found)
signal-integrity model Connector
pins: 1 TD+, 2 TCT, 3 TD-, 6 RD+, 7 RCT, 8 RD-, 9 RX-, 10 CMR, 11 RX+, 14 TX-, 15 CMT, 16 TX+

## LPJ0514GENL
designator J?
LINK-PP LPJ0514GENL  RJ-45 Connector; Value: RJ45 POE; Solder: WAVE; MPN: LPJ0514GENL; MFR: LINK-PP
footprint LPJ0514GENL (Footprint not found)
pins: 1 TD+, 2 TD-, 3 RD+, 4 TCT, 5 V1+, 6 RD-, 7 NC, 8 V1-, 9 V2+, 10 V2-, 11 LED.G_A, 12 LED.G_K, 13 LED.Y_A, 14 LED.Y_K, MP SHIELD, MP SHIELD

## LPJK7003B98NL
designator J?
Ethernet Connectors 1x1 LOW PROFILE , GIGABIT; MFR: LinkPP; Solder: WAVE; MPN: LPJK7003B98NL; Value: LPJK7003B98NL
footprint LPJK7003B98NL
pins: 1 TRCT3, 2 TRD3-, 3 TRD3+, 4 TRD2+, 5 TRD2-, 6 TRCT2, 7 TRCT4, 8 TRD4+, 9 TRD4-, 10 TDR1-, 11 TDR1+, 12 TRCT1, 13 YEL-, 14 YEL+, 15 ORN-, 16 COM+, 17 GRN-, SH1 SHIELD (power), SH2 SHIELD (power)

## LTI-IPXSM66AL
designator AT?, comment IPEX_CON  (value not drawn)
IPEX CONNECTER ANTENNA GPS GSM; MPN: LTI-IPXSM66AL; Solder: SMT; Value: IPEX_CON
footprint U.FL/UMCC (U.FL (UMCC) Connector Jack, Male Pin 50Ohm Surface Mount Solder)
pins: 1 AT, 2 0

## MICRO_37
designator H?, comment USB-MICRO
CONN RECEPT MINI USB R/A 5POS SMD; MPN: MICRO-37; Solder: WAVE; Value: USB-MICRO; MFR_URL: https://item.taobao.com/item.htm?id=575122934297&ali_refid=a3_430008_1006:1159190121:N:micro+usb+%E5%BA%A7:f3882559d872b66fa6d4c50709947fc8&ali_trackid=1_f3882559d872b66fa6d4c50709947fc8&spm=a230r.1.0.0
footprint MICRO-37
pins: 1 VCC, 2 D-, 3 D+, 4 ID, 5 GND

## MicroSIM_Holder
designator P?, comment MicroSIM Card Push - Push Holder
MFR_URL: Link mua hàng:  http://www.kme.com.vn/khay-micro-sim-y.html; CompanyID: VT-01312; Solder: SMT; Value: MicroSIM Card Push - Push Holder
footprint MicroSIM Card PUSH - PUSH HOLDER
pins: 1 VCC, 2 RST, 3 CLK, 5 GND, 6 VPP, 7 I/O, 8 CASE, 9 CASE

## MOLEX-052437-2433
designator P?
CONN FFC BOTTOM 24POS 0.50MM R/A; MFR: Molex; MPN: 052437-2433; Solder: SMT; Value: MOLEX-052437-2433
footprint MOLEX-052437-2433 (Footprint not found)
signal-integrity model Connector
pins: 0 MP, 1, 2, 3, 4, 5, 6, 7, 8, 9, 10, 11, 12, 13, 14, 15, 16, 17, 18, 19, 20, 21, 22, 23, 24

## MOLEX-54104-4031
designator P?
CONN FFC BOTTOM 40POS 0.50MM R/A; MFR: Molex; MPN: 54104-4031; Solder: SMT; Value: MOLEX-54104-4031
footprint MOLEX-54132-4033 (Footprint not found)
signal-integrity model Connector
pins: 0 MP, 1, 2, 3, 4, 5, 6, 7, 8, 9, 10, 11, 12, 13, 14, 15, 16, 17, 18, 19, 20, 21, 22, 23, 24, 25, 26, 27, 28, 29, 30, 31, 32, 33, 34, 35, 36, 37, 38, 39, 40

## MOLEX-54104-4033
designator P?
CONN FFC TOP 40POS 0.50MM R/A; MFR: Molex; MPN: 054132-4033; Solder: SMT; Value: MOLEX-054132-4033
footprint MOLEX-54104-4031 (FPC Connector, 40-Leads, Right Angle, Pitch 0.5 mm, Mated Height 2.0 mm, SMT)
signal-integrity model Connector
pins: 0 MP, 1, 2, 3, 4, 5, 6, 7, 8, 9, 10, 11, 12, 13, 14, 15, 16, 17, 18, 19, 20, 21, 22, 23, 24, 25, 26, 27, 28, 29, 30, 31, 32, 33, 34, 35, 36, 37, 38, 39, 40

## MOLEX-0894010510
designator P?, comment CONNECTOR
CONN HEADER R/A 5POS 2.0MM; MFR: Molex; MPN: 0894010510; Solder: WAVE
footprint MOLEX-0894010810 (Footprint not found)
pins: 1, 2, 3, 4, 5, 6, 7, 8

## MOLEX-0894010810
designator P?, comment CONNECTOR
CONN HEADER R/A 8POS 2MM; MFR: Molex; MPN: 0894010810; Solder: WAVE
footprint MOLEX-0894010510
pins: 1, 2, 3, 4, 5

## MOLEX-1053101108
designator P?, comment CONNECTOR
CONN HEADER VERT 8POS 2.5MM; MPN: 1053101108; Solder: WAVE
footprint MOLEX-1053101108 (Footprint not found)
footprint MOLEX-1053101108-STAND (Footprint not found)
pins: 1, 2, 3, 4, 5, 6, 7, 8

## MOLEX-1053141308
designator P?, comment CONNECTOR
CONN HEADER R/A 8POS 2.5MM; MPN: 1053141308; Solder: WAVE
footprint MOLEX_1053141308 (Footprint not found)
pins: 1, 2, 3, 4, 5, 6, 7, 8

## MOLEX_43045-1000
designator P?, comment Header 5x2H Molex
Header, 5-Pin, Dual row, Right Angle, Pitch 3mm; MPN: 43045-1000; CompanyID: VT-01112; Solder: WAVE; Value: Header 5x2H Molex; MFR: MOLEX
footprint MOLEX_B2B_5X2_3.0MM
pins: 1, 2, 3, 4, 5, 6, 7, 8, 9, 10

## MOLEX_043045-1014
designator P?, comment Micro FIt 5x2_3MM
CONN HEADER VERT 10POS 3MM; MPN: 043045-1014; MFR: MOLEX; Solder: WAVE; Value: Micro FIt 5x2_3MM
footprint MOLEX_043045-1014-MID (Footprint not found)
pins: 1, 2, 3, 4, 5, 6, 7, 8, 9, 10

## MOLEX_0008701039
designator P?, comment CRIMP  (mechanical)
CONN SOCKET 22-28AWG CRIMP TIN / (used for 2205-7085); MFR: Molex; MPN: 0008701039; Solder: HAND

## MOLEX_22057085
designator P?, comment HDR_8x1
CONN HEADER R/A 8POS 2.5MM; MFR: Molex; MPN: 22057085; Solder: SMT
footprint MOLEX_22057085 (Footprint not found)
pins: 1, 2, 3, 4, 5, 6, 7, 8

## MOLEX_0039301020
designator P?, comment 1x2
CONN HEADER R/A 2POS 4.2MM; MFR: MOLEX; MPN: 0039301020; Solder: WAVE; Value: 0039301020
footprint CON1X2ANGLE
pins: 1, 2

## MOLEX_0039301040
designator P?, comment 2x2
CONN HEADER R/A 4POS 4.2MM; MFR: MOLEX; MPN: 0039301040; Solder: WAVE; Value: 0039301040
signal-integrity model Connector
footprint CON2X2ANGLE
pins: 1, 2, 3, 4